# Altium footprint library AltiumLibrary.PcbLib: 127 footprints (part 5 of 8)
Each footprint in its own frame and in the unit in brackets; x right, y up, seen from the top. Pads: shape width x height; smd on the part's side, far side on the other; paste and mask are expansions set on the pad; w line width, h text height; cw(c..) or ccw(c..) is an arc to the next point about the centre after c.
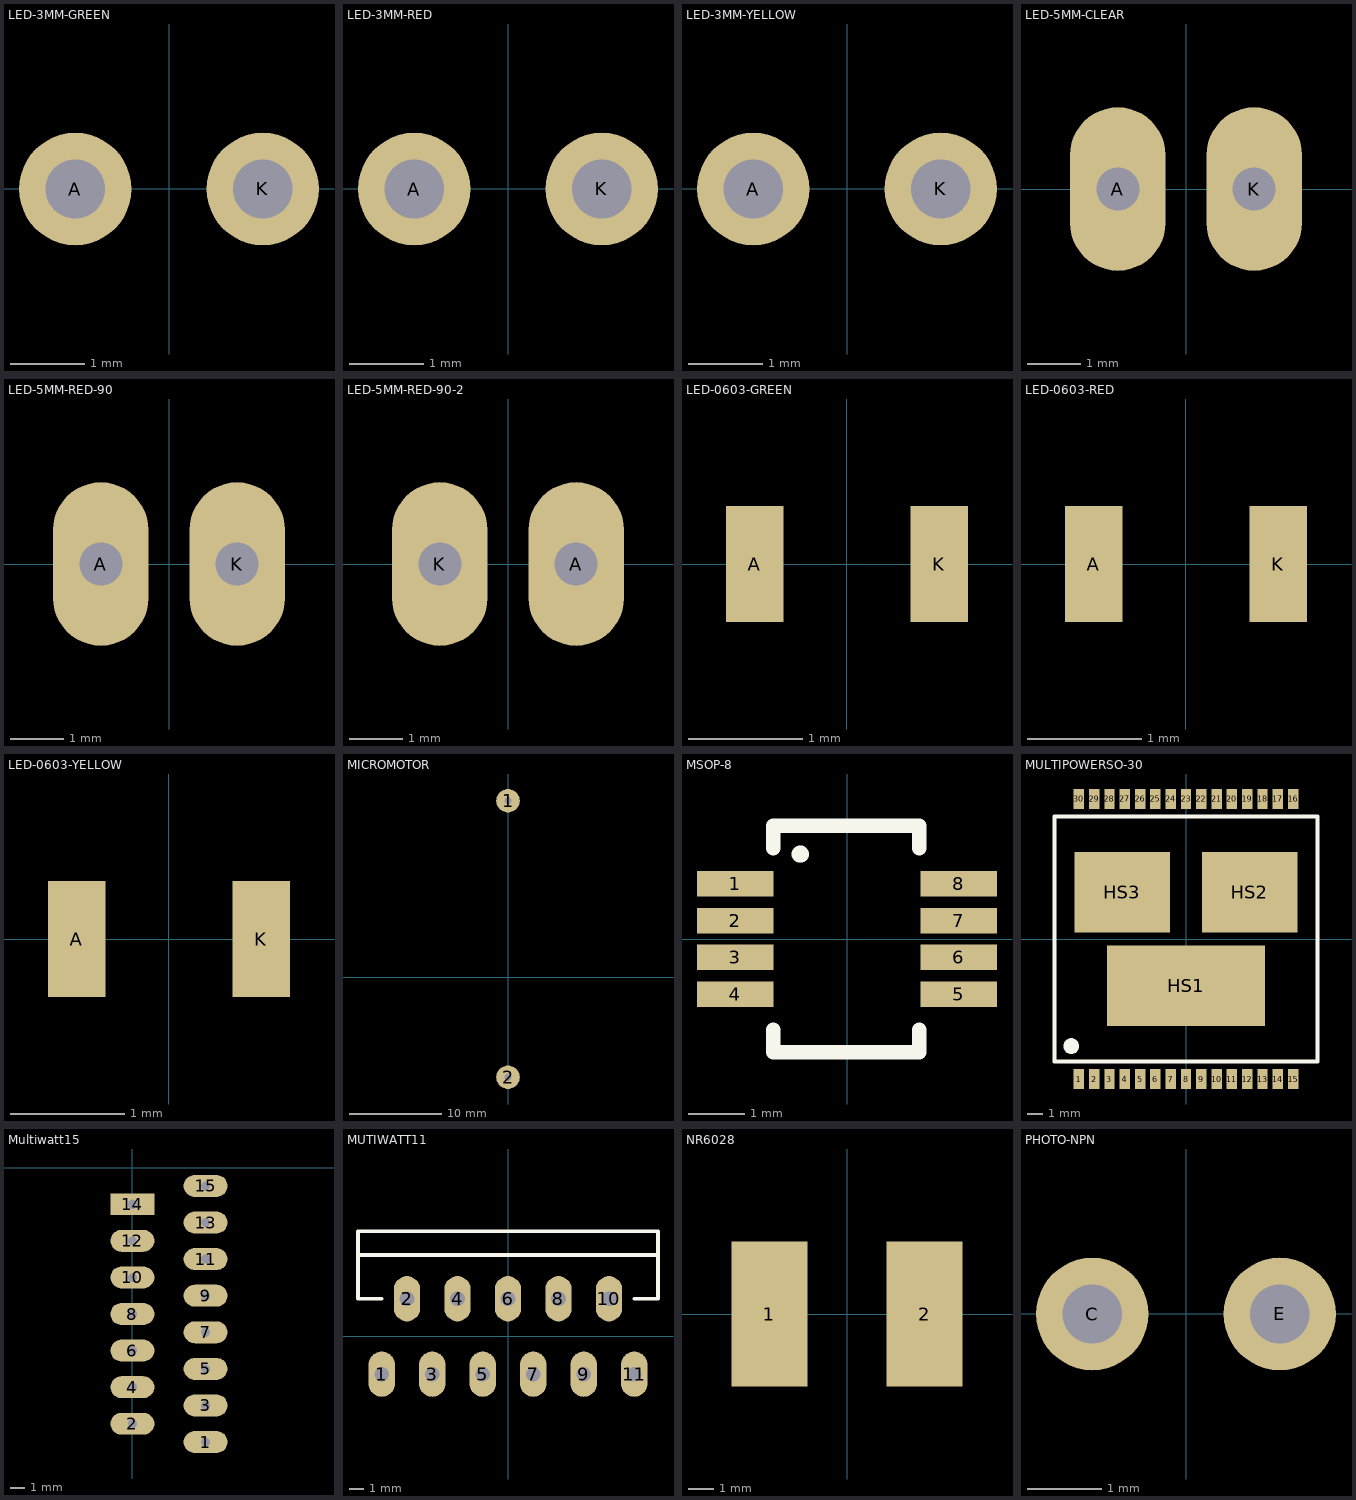
[diagram p4: the footprints below, top view; thin cyan lines are the x and y axes]

## LED-3MM-GREEN [mil]
pads (2):
  round 60 hole 31.5: A(-50,0) K(50,0)
3D body "SW3dPS-LEDd3G.STEP": height 217.04, standoff -97.93, extent -65.51,-65.13 64.41,64.79

## LED-3MM-RED [mil]
pads (2):
  round 60 hole 31.5: A(-50,0) K(50,0)
3D body "SW3dPS-LEDd3R.STEP": height 217.04, standoff -97.93, extent -65.51,-65.13 64.41,64.8

## LED-3MM-YELLOW [mil]
pads (2):
  round 60 hole 31.5: A(-50,0) K(50,0)
3D body "SW3dPS-LEDd3Y.STEP": height 217.04, standoff -97.93, extent -65.51,-65.13 64.41,64.8

## LED-5MM-CLEAR [mil]
pads (2):
  oval 70x120 hole 31.5: A(-50,0) K(50,0)
3D body "LED 5mm.STEP": height 346.46, standoff -1062.99, extent -118.11,-118.1 98.42,118.1

## LED-5MM-RED-90 [mil]
pads (2):
  oval 70x120 hole 31.5: A(-50,0) K(50,0)
3D body "LED 5mm, Red, Thru-hole, Right Angle PCB 2.stp": height 234.07, standoff -125.98, extent -116.14,-421.26 96.46,9.85

## LED-5MM-RED-90-2 [mil]
pads (2):
  oval 70x120 hole 31.5: A(50,0) K(-50,0)
3D body "LED 5mm, Red, Thru-hole, Right Angle PCB 1.stp": height 234.08, standoff -125.98, extent -96.45,-421.26 116.14,9.85

## LED-0603-GREEN [mil]
pads (2):
  rect 20x40 smd: A(-31.89,0) K(31.89,0)
3D body "User Library-led0603_GRE.step": height 43.31, standoff 0, extent -31.89,-15.74 31.89,15.75

## LED-0603-RED [mil]
pads (2):
  rect 20x40 smd: A(-31.89,0) K(31.89,0)
3D body "User Library-led0603_RED.step": height 43.31, standoff 0, extent -31.89,-15.74 31.89,15.75

## LED-0603-YELLOW [mil]
pads (2):
  rect 20x40 smd: A(-31.89,0) K(31.89,0)
3D body "User Library-led0603_YEL.step": height 43.31, standoff 0, extent -31.89,-15.74 31.89,15.75

## MICROMOTOR [mm]
pads (2):
  round 2.54 hole 0.8: 1(0,19.05) 2(0,-10.795)
3D body "User Library-Pololu Extended Micro Metal Bracket.step": height 11.5, standoff 0, extent 7.366,-9.525 24.666,17.075
3D body "User Library-MOTOR, POLOLU.step": height 9.95, standoff -0.05, extent -0.762,-2.094 34.008,9.906

## MSOP-8 [mm]
pads (8):
  rect 1.35x0.45 smd: 1(-1.975,0.975) 2(-1.975,0.325) 3(-1.975,-0.325) 4(-1.975,-0.975) 5(1.975,-0.975) 6(1.975,-0.325) 7(1.975,0.325) 8(1.975,0.975)
Top Overlay:
  circle w0.254: c-0.825,1.5 r0.025
  lines w0.254: -1.3,-1.6 -1.3,-2 1.275,-2 1.275,-1.6 ; -1.3,1.6 -1.3,2 1.275,2 1.275,1.6
3D body "MSOP-8_MSE-M.step": height 1.09, standoff 0, extent -2.527,-1.549 2.527,1.549

## MULTIPOWERSO-30 [mm]
pads (33):
  rect 0.68x1.3 smd: 1(-7,-9.15) 2(-6,-9.15) 3(-5,-9.15) 4(-4,-9.15) 5(-3,-9.15) 6(-2,-9.15) 7(-1,-9.15) 8(0,-9.15) 9(1,-9.15) 10(2,-9.15) 11(3,-9.15) 12(4,-9.15) 13(5,-9.15) 14(6,-9.15) 15(7,-9.15) 16(7,9.15) 17(6,9.15) 18(5,9.15) 19(4,9.15) 20(3,9.15) 21(2,9.15) 22(1,9.15) 23(0,9.15) 24(-1,9.15) 25(-2,9.15) 26(-3,9.15) 27(-4,9.15) 28(-5,9.15) 29(-6,9.15) 30(-7,9.15)
  rect 10.3x5.25 smd: HS1(0,-3.05)
  rect 6.23x5.25 smd: HS2(4.165,3.05) HS3(-4.165,3.05)
Top Overlay:
  region: -7.5,-7.5 -7.599,-7.5 -7.783,-7.424 -7.924,-7.283 -8,-7.099 -8,-7 -8,-6.901 -7.924,-6.717 -7.783,-6.576 -7.599,-6.5 -7.5,-6.5 -7.401,-6.5 -7.217,-6.576 -7.076,-6.717 -7,-6.901 -7,-7 -7,-7.099 -7.076,-7.283 -7.217,-7.424 -7.401,-7.5
  lines w0.254: -8.6,-8 8.6,-8 8.6,8 -8.6,8 -8.6,-8
3D body "User Library-multipowerSO-30.step": height 2.25, standoff -0.1, extent -8.65,-9.574 8.65,9.575

## Multiwatt15 [mil]
pads (15):
  oval 120x60 hole 25: 1(200,-750) 2(0,-700) 3(200,-650) 4(0,-600) 5(200,-550) 6(0,-500) 7(200,-450) 8(0,-400) 9(200,-350) 10(0,-300) 11(200,-250) 12(0,-200) 13(200,-150) 15(200,-50)
  rect 120x60 hole 25: 14(0,-100)
3D body "User Library-Multiwatt15V.STEP": height 831.1, standoff -46.85, extent -175,-785.83 214.37,-14.17

## MUTIWATT11 [mil]
pads (11):
  oval 70x120 hole 39.37: 1(-334.65,-100) 2(-267.72,100) 3(-200.79,-100) 4(-133.86,100) 5(-66.93,-100) 6(0,100) 7(66.93,-100) 8(133.86,100) 9(200.79,-100) 10(267.72,100) 11(334.65,-100)
Top Overlay:
  lines w10: -397.64,216.14 397.64,216.14 ; -334.65,100 -397.64,100 -397.64,279.13 397.64,279.13 397.64,100 334.65,100
3D body "User Library-Multiwatt11V.step": height 858.27, standoff -125.98, extent -397.64,-113.78 397.64,275.59

## NR6028 [mm]
pads (2):
  rect 3x5.7 smd: 1(-3.05,0) 2(3.05,0)
3D body "IND_TAIYO_NR6028.step": height 2.79, standoff 0, extent -3.099,-3.101 3.099,3.101

## PHOTO-NPN [mil]
pads (2):
  round 60 hole 31.5: C(-50,0) E(50,0)
3D body "LED 3mm, Red, Thru-hole, Right Angle PCB 1.stp": height 154.51, standoff -125.98, extent -75.78,-9.84 64.77,287.4